# Altium footprint library RDM_ALT_PCB.PcbLib: 127 footprints (part 8 of 8)
Each footprint in its own frame and in the unit in brackets; x right, y up, seen from the top. Pads: shape width x height; smd on the part's side, far side on the other; paste and mask are expansions set on the pad; w line width, h text height; cw(c..) or ccw(c..) is an arc to the next point about the centre after c.
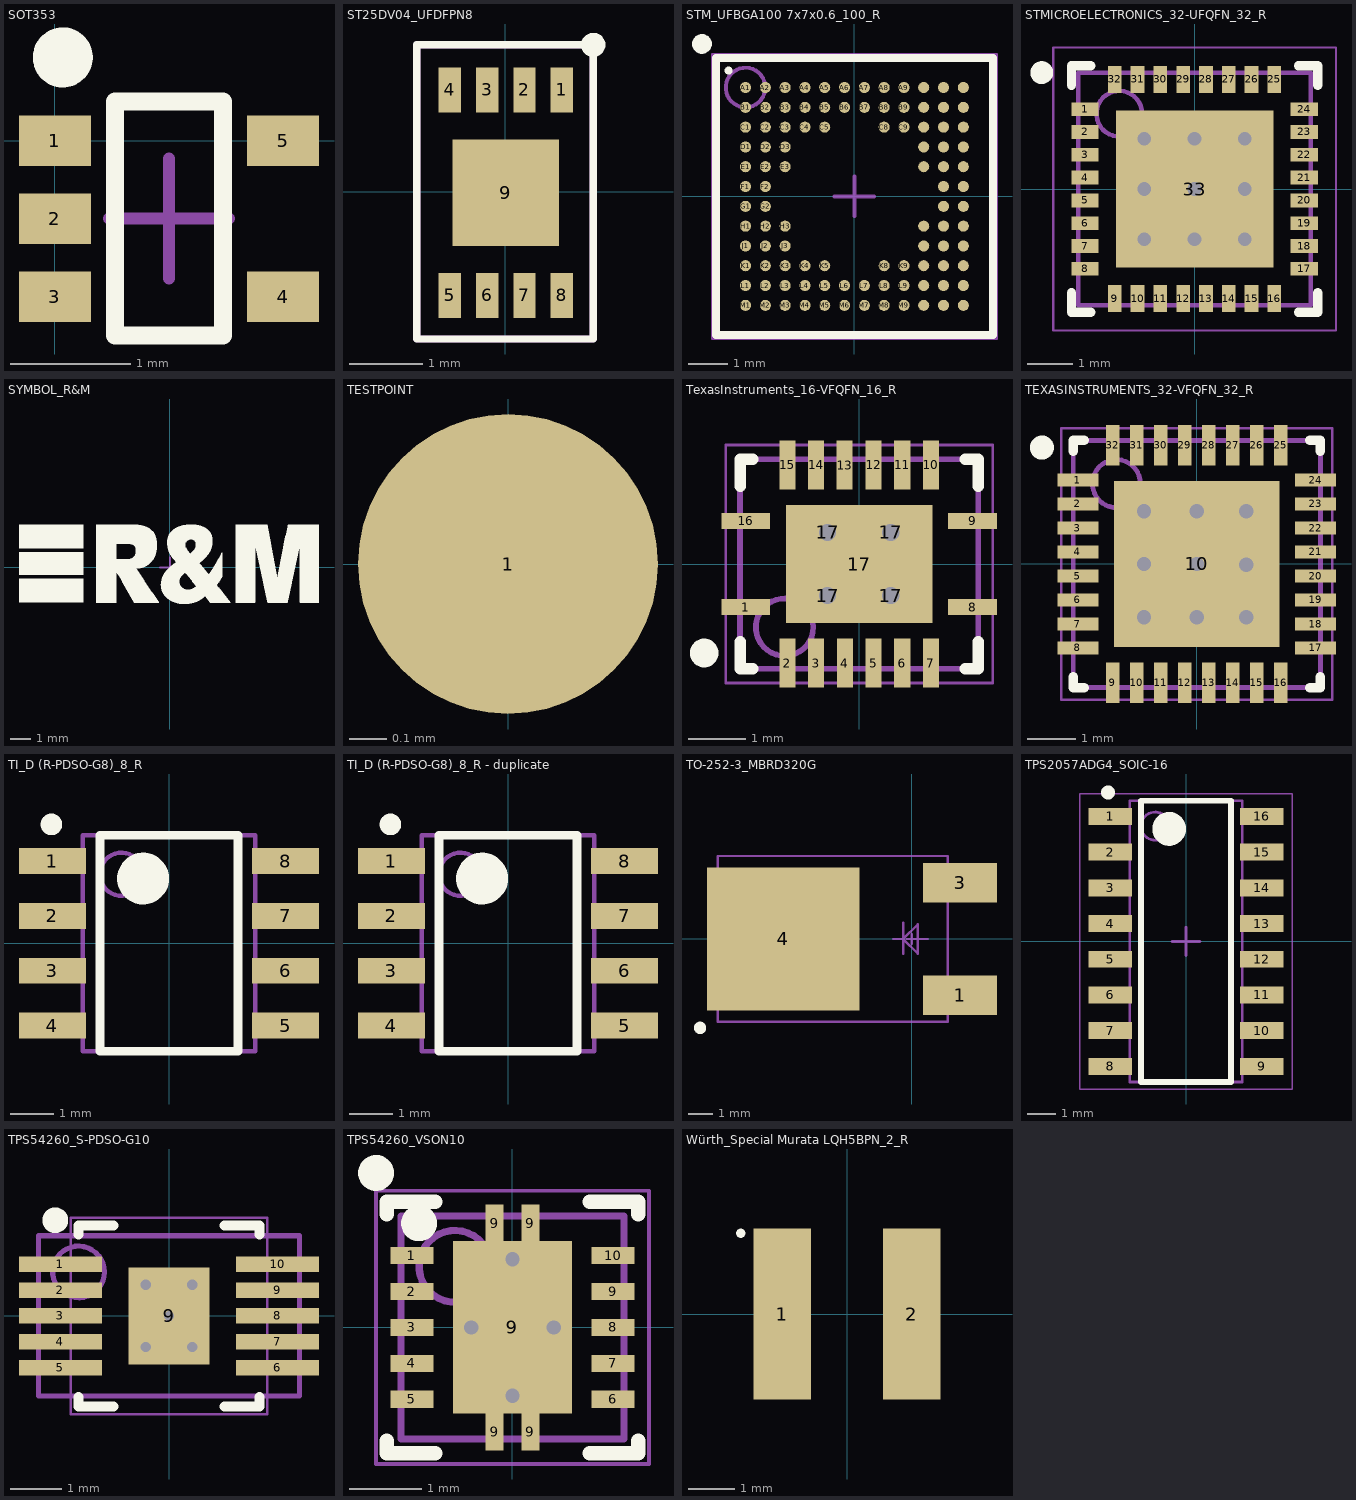
[diagram p7: the footprints below, top view; thin cyan lines are the x and y axes]

## SOT353 [mm]
pads (5):
  rect 0.6x0.42 smd: 1(0,0) 2(0,-0.65) 3(0,-1.3) 4(1.9,-1.3) 5(1.9,0)
Top Overlay:
  circle w0.25: c0.065,0.693 r0.125
  lines w0.15: 0.737,0.325 1.4,0.325 1.4,-1.625 0.5,-1.625 0.5,0.325 1.062,0.325
Mechanical 15:
  lines w0.1: 0.45,-0.65 1.45,-0.65 ; 0.95,-1.15 0.95,-0.15
3D body "SOT353-1.stp": height 1.09, standoff 0, extent -0.18,-1.78 2.08,0.48

## ST25DV04_UFDFPN8 [mil] "UFDFPN8"
height 23.62
pads (9):
  rect 12x24 smd: 1(30.39,54.61) 2(10.39,54.61) 3(-9.61,54.61) 4(-29.61,54.61) 5(-29.61,-55.39) 6(-9.61,-55.39) 7(10.39,-55.39) 8(30.39,-55.39)
  rect 57.09x57.09 smd: 9(0.39,-0.39)
Top Overlay:
  circle w6.69: c47.24,78.74 r3.15
  lines w3.94: -47.24,-78.74 -47.24,78.74 ; -47.24,-78.74 47.24,-78.74 ; -47.24,-78.74 47.24,-78.74 ; -47.24,-78.74 -47.24,78.74 ; -47.24,-78.74 -47.24,78.74 ; -47.24,-78.74 47.24,-78.74 ; -47.24,-78.74 47.24,-78.74 ; -47.24,-78.74 -47.24,78.74 ; -47.24,78.74 47.24,78.74 ; -47.24,78.74 47.24,78.74 ; -47.24,78.74 47.24,78.74 ; -47.24,78.74 47.24,78.74 ; 47.24,-78.74 47.24,78.74 ; 47.24,-78.74 47.24,78.74 ; 47.24,-78.74 47.24,78.74 ; 47.24,-78.74 47.24,78.74
Mechanical 15:
  circle w3.94: c0,0 r1.97
  lines w3.94: -47.24,-78.74 47.24,-78.74 47.24,78.74 -47.24,78.74 -47.24,-78.74
3D body "User Library-UFDFPN8.STEP": height 22.16, standoff 0.5, extent -39.37,-59.06 39.37,59.06

## STM_UFBGA100 7x7x0.6_100_R [mm] "STM_UFBGA100 7x7x0.6_100_R"
height 0.6
pads (100):
  round 0.28 smd mask+0.09: A1(-2.75,2.75) A2(-2.25,2.75) A3(-1.75,2.75) A4(-1.25,2.75) A5(-0.75,2.75) A6(-0.25,2.75) A7(0.25,2.75) A8(0.75,2.75) A9(1.25,2.75) A10(1.75,2.75) A11(2.25,2.75) A12(2.75,2.75) B1(-2.75,2.25) B2(-2.25,2.25) B3(-1.75,2.25) B4(-1.25,2.25) B5(-0.75,2.25) B6(-0.25,2.25) B7(0.25,2.25) B8(0.75,2.25) B9(1.25,2.25) B10(1.75,2.25) B11(2.25,2.25) B12(2.75,2.25) C1(-2.75,1.75) C2(-2.25,1.75) C3(-1.75,1.75) C4(-1.25,1.75) C5(-0.75,1.75) C8(0.75,1.75) C9(1.25,1.75) C10(1.75,1.75) C11(2.25,1.75) C12(2.75,1.75) D1(-2.75,1.25) D2(-2.25,1.25) D3(-1.75,1.25) D10(1.75,1.25) D11(2.25,1.25) D12(2.75,1.25) E1(-2.75,0.75) E2(-2.25,0.75) E3(-1.75,0.75) E10(1.75,0.75) E11(2.25,0.75) E12(2.75,0.75) F1(-2.75,0.25) F2(-2.25,0.25) F11(2.25,0.25) F12(2.75,0.25) G1(-2.75,-0.25) G2(-2.25,-0.25) G11(2.25,-0.25) G12(2.75,-0.25) H1(-2.75,-0.75) H2(-2.25,-0.75) H3(-1.75,-0.75) H10(1.75,-0.75) H11(2.25,-0.75) H12(2.75,-0.75) J1(-2.75,-1.25) J2(-2.25,-1.25) J3(-1.75,-1.25) J10(1.75,-1.25) J11(2.25,-1.25) J12(2.75,-1.25) K1(-2.75,-1.75) K2(-2.25,-1.75) K3(-1.75,-1.75) K4(-1.25,-1.75) K5(-0.75,-1.75) K8(0.75,-1.75) K9(1.25,-1.75) K10(1.75,-1.75) K11(2.25,-1.75) K12(2.75,-1.75) L1(-2.75,-2.25) L2(-2.25,-2.25) L3(-1.75,-2.25) L4(-1.25,-2.25) L5(-0.75,-2.25) L6(-0.25,-2.25) L7(0.25,-2.25) L8(0.75,-2.25) L9(1.25,-2.25) L10(1.75,-2.25) L11(2.25,-2.25) L12(2.75,-2.25) M1(-2.75,-2.75) M2(-2.25,-2.75) M3(-1.75,-2.75) M4(-1.25,-2.75) M5(-0.75,-2.75) M6(-0.25,-2.75) M7(0.25,-2.75) M8(0.75,-2.75) M9(1.25,-2.75) M10(1.75,-2.75) M11(2.25,-2.75) M12(2.75,-2.75)
Top Overlay:
  circle w0.2: c-3.175,3.175 r0.001
  circle w0.25: c-3.85,3.85 r0.125
  lines w0.2: -3.5,-3.5 -3.5,3.5 3.5,3.5 3.5,-3.5 -3.5,-3.5
Mechanical 13:
  circle w0.1: c-2.75,2.75 r0.5
  lines w0.1: -3.5,-3.5 -3.5,3.5 3.5,3.5 3.5,-3.5 -3.5,-3.5
Mechanical 15:
  lines w0.05: -3.6,-3.6 -3.6,3.6 3.6,3.6 3.6,-3.6 -3.6,-3.6
  lines w0.1: -0.5,0 0.5,0 ; 0,-0.5 0,0.5
3D body: height 0.6, standoff 0.11, extent -3.5,-3.5 3.5,3.5

## STMICROELECTRONICS_32-UFQFN_32_R [mm]
pads (33):
  rect 0.6x0.3 smd: 1(-2.4,1.75) 2(-2.4,1.25) 3(-2.4,0.75) 4(-2.4,0.25) 5(-2.4,-0.25) 6(-2.4,-0.75) 7(-2.4,-1.25) 8(-2.4,-1.75) 17(2.4,-1.75) 18(2.4,-1.25) 19(2.4,-0.75) 20(2.4,-0.25) 21(2.4,0.25) 22(2.4,0.75) 23(2.4,1.25) 24(2.4,1.75)
  rect 0.3x0.6 smd: 9(-1.75,-2.4) 10(-1.25,-2.4) 11(-0.75,-2.4) 12(-0.25,-2.4) 13(0.25,-2.4) 14(0.75,-2.4) 15(1.25,-2.4) 16(1.75,-2.4) 25(1.75,2.4) 26(1.25,2.4) 27(0.75,2.4) 28(0.25,2.4) 29(-0.25,2.4) 30(-0.75,2.4) 31(-1.25,2.4) 32(-1.75,2.4)
  rect 3.45x3.45 smd: 33(0,0)
via -1.1,1.1 diameter 0.5 hole 0.3
via 0,1.1 diameter 0.5 hole 0.3
via 1.1,1.1 diameter 0.5 hole 0.3
via -1.1,0 diameter 0.5 hole 0.3
via 0,0 diameter 0.5 hole 0.3
via 1.1,0 diameter 0.5 hole 0.3
via -1.1,-1.1 diameter 0.5 hole 0.3
via 0,-1.1 diameter 0.5 hole 0.3
via 1.1,-1.1 diameter 0.5 hole 0.3
Top Overlay:
  circle w0.25: c-3.35,2.55 r0.125
  lines w0.2: -2.7,-2.275 -2.7,-2.7 -2.275,-2.7 ; -2.7,2.275 -2.7,2.7 -2.275,2.7 ; 2.275,-2.7 2.7,-2.7 2.7,-2.275 ; 2.275,2.7 2.7,2.7 2.7,2.275
Mechanical 13:
  circle w0.1: c-1.65,1.65 r0.5
  lines w0.1: -2.55,-2.55 -2.55,2.55 2.55,2.55 2.55,-2.55 -2.55,-2.55
Mechanical 15:
  lines w0.05: -3.1,-3.1 -3.1,3.1 3.1,3.1 3.1,-3.1 -3.1,-3.1
  lines w0.1: -0.5,0 0.5,0 ; 0,-0.5 0,0.5
3D body "QFN50P500X500X60_HS-33N.step": height 0.6, standoff 0, extent -2.6,-2.6 2.6,2.6

## SYMBOL_R&M [mm] "Reichle & De-Massari printing"
Top Overlay:
  drawing of 1139 lines, arcs and shapes, not listed
Mechanical 15:
  lines w0.1: -0.5,0 0.5,0 ; 0,-0.5 0,0.5

## TESTPOINT [mm] "Testpoint"
pads (1):
  round 0.8 smd paste-0.8 mask+0.102: 1(0,0)

## TexasInstruments_16-VFQFN_16_R [mm]
pads (21):
  rect 0.85x0.28 smd: 1(-1.975,-0.75) 8(1.975,-0.75) 9(1.975,0.75) 16(-1.975,0.75)
  rect 0.28x0.85 smd: 2(-1.25,-1.725) 3(-0.75,-1.725) 4(-0.25,-1.725) 5(0.25,-1.725) 6(0.75,-1.725) 7(1.25,-1.725) 10(1.25,1.725) 11(0.75,1.725) 12(0.25,1.725) 13(-0.254,1.724) 14(-0.75,1.725) 15(-1.25,1.725)
  round 0.55 hole 0.3: 17(-0.55,-0.55) 17(-0.55,0.55) 17(0.55,-0.55) 17(0.55,0.55)
  rect 2.55x2.05 smd: 17(0,0)
Top Overlay:
  circle w0.25: c-2.7,-1.55 r0.125
  lines w0.2: -2.075,-1.35 -2.075,-1.825 -1.85,-1.825 ; -2.075,1.35 -2.075,1.825 -1.85,1.825 ; 1.85,-1.825 2.075,-1.825 2.075,-1.35 ; 1.85,1.825 2.075,1.825 2.075,1.35
Mechanical 13:
  circle w0.1: c-1.3,-1.1 r0.5
  lines w0.1: -2.075,-1.825 -2.075,1.825 2.075,1.825 2.075,-1.825 -2.075,-1.825
Mechanical 15:
  lines w0.05: -2.325,-2.075 -2.325,2.075 2.325,2.075 2.325,-2.075 -2.325,-2.075
  lines w0.1: -0.5,0 0.5,0 ; 0,-0.5 0,0.5
3D body "PQFN50P400X350X100_HS-17N.step": height 1, standoff 0, extent -2.075,-1.825 2.075,1.825

## TEXASINSTRUMENTS_32-VFQFN_32_R [mm]
pads (33):
  rect 0.85x0.28 smd: 1(-2.475,1.75) 2(-2.475,1.25) 3(-2.475,0.75) 4(-2.475,0.25) 5(-2.475,-0.25) 6(-2.475,-0.75) 7(-2.475,-1.25) 8(-2.475,-1.75) 17(2.475,-1.75) 18(2.475,-1.25) 19(2.475,-0.75) 20(2.475,-0.25) 21(2.475,0.25) 22(2.475,0.75) 23(2.475,1.25) 24(2.475,1.75)
  rect 0.28x0.85 smd: 9(-1.75,-2.475) 10(-1.25,-2.475) 11(-0.75,-2.475) 12(-0.25,-2.475) 13(0.25,-2.475) 14(0.75,-2.475) 15(1.25,-2.475) 16(1.75,-2.475) 25(1.75,2.475) 26(1.25,2.475) 27(0.75,2.475) 28(0.25,2.475) 29(-0.25,2.475) 30(-0.75,2.475) 31(-1.25,2.475) 32(-1.75,2.475)
  rect 3.45x3.45 smd: 10(0,0)
via -1.1,-1.112 diameter 0.55 hole 0.3
via 1.028,-0.012 diameter 0.55 hole 0.3
via 1.028,1.1 diameter 0.55 hole 0.3
via 1.028,-1.112 diameter 0.55 hole 0.3
via 0,-1.112 diameter 0.55 hole 0.3
via -1.1,0 diameter 0.55 hole 0.3
via 0,0 diameter 0.55 hole 0.3
via -1.1,1.1 diameter 0.55 hole 0.3
via 0,1.1 diameter 0.55 hole 0.3
Top Overlay:
  circle w0.25: c-3.225,2.425 r0.125
  lines w0.2: -2.575,-2.35 -2.575,-2.575 -2.35,-2.575 ; -2.575,2.35 -2.575,2.575 -2.35,2.575 ; 2.35,-2.575 2.575,-2.575 2.575,-2.35 ; 2.35,2.575 2.575,2.575 2.575,2.35
Mechanical 13:
  circle w0.1: c-1.675,1.675 r0.5
  lines w0.1: -2.575,-2.575 2.575,-2.575 2.575,2.575 -2.575,2.575 -2.575,-2.575
Mechanical 15:
  lines w0.05: -2.825,-2.825 2.825,-2.825 2.825,2.825 -2.825,2.825 -2.825,-2.825
  lines w0.1: -0.5,0 0.5,0 ; 0,-0.5 0,0.5
3D body "PQFN50P500X500X100_HS-33N.step": height 1, standoff 0, extent -2.575,-2.575 2.575,2.575

## TI_D (R-PDSO-G8)_8_R [mm] "TI_D (R-PDSO-G8)_8_R"
height 1.75
pads (8):
  rect 1.55x0.6 smd: 1(-2.7,1.905) 2(-2.7,0.635) 3(-2.7,-0.635) 4(-2.7,-1.905) 5(2.7,-1.905) 6(2.7,-0.635) 7(2.7,0.635) 8(2.7,1.905)
Top Overlay:
  circle w0.6: c-0.6,1.5 r0.3
  circle w0.25: c-2.725,2.755 r0.125
  lines w0.2: -1.6,-2.5 1.6,-2.5 1.6,2.5 -1.6,2.5 -1.6,-2.5
Mechanical 13:
  circle w0.1: c-1.1,1.6 r0.5
  lines w0.1: -2,-2.5 2,-2.5 2,2.5 -2,2.5 -2,-2.5
3D body "SOIC-8akaD0008AakaM08A.stp": height 1.63, standoff 0, extent -3,-2.45 3,2.45

## TI_D (R-PDSO-G8)_8_R - duplicate [mm] "TI_D (R-PDSO-G8)_8_R"
height 1.75
pads (8):
  rect 1.55x0.6 smd: 1(-2.7,1.905) 2(-2.7,0.635) 3(-2.7,-0.635) 4(-2.7,-1.905) 5(2.7,-1.905) 6(2.7,-0.635) 7(2.7,0.635) 8(2.7,1.905)
Top Overlay:
  circle w0.6: c-0.6,1.5 r0.3
  circle w0.25: c-2.725,2.755 r0.125
  lines w0.2: -1.6,-2.5 1.6,-2.5 1.6,2.5 -1.6,2.5 -1.6,-2.5
Mechanical 13:
  circle w0.1: c-1.1,1.6 r0.5
  lines w0.1: -2,-2.5 2,-2.5 2,2.5 -2,2.5 -2,-2.5
3D body "SOIC-8akaD0008AakaM08A.stp": height 1.63, standoff 0, extent -3,-2.45 3,2.45

## TO-252-3_MBRD320G [mm] "TO-252-3_MBRD320G"
height 2.47
pads (3):
  rect 3x1.6 smd: 1(1.959,-2.285) 3(1.959,2.285)
  rect 6.2x5.8 smd: 4(-5.221,0)
Top Overlay:
  circle w0.25: c-8.593,-3.607 r0.125
Mechanical 1:
  lines w0.1: -0.2,0 0.2,0 ; 0,-0.2 0,0.2
Mechanical 13:
  lines w0.1: -7.871,-3.363 1.466,-3.363 1.466,3.369 -7.871,3.369 -7.871,-3.363
Mechanical 15:
  lines w0.1: -0.75,0 -0.35,0 ; -0.35,-0.6 -0.35,0.6 -0.35,0.65 ; 0.25,0 0.65,0 ; -0.35,0 0.25,-0.6 0.25,0.6 -0.35,0
3D body "DPAK.step": height 2.44, standoff 0, extent -7.871,-3.363 1.466,3.369

## TPS2057ADG4_SOIC-16 [mm] "SOIC, 16-Leads, Body 10.00x4.00mm, Pitch 1.27mm, IPC Medium Density"
height 1.75
pads (16):
  rect 1.55x0.6 smd: 1(-2.7,4.445) 2(-2.7,3.175) 3(-2.7,1.905) 4(-2.7,0.635) 5(-2.7,-0.635) 6(-2.7,-1.905) 7(-2.7,-3.175) 8(-2.7,-4.445) 9(2.7,-4.445) 10(2.7,-3.175) 11(2.7,-1.905) 12(2.7,-0.635) 13(2.7,0.635) 14(2.7,1.905) 15(2.7,3.175) 16(2.7,4.445)
Top Overlay:
  circle w0.6: c-0.6,4 r0.3
  circle w0.25: c-2.775,5.295 r0.125
  lines w0.2: -1.6,-5 1.6,-5 1.6,5 -1.6,5 -1.6,-5
Mechanical 13:
  circle w0.1: c-1.1,4.1 r0.5
  lines w0.1: -2,-5 2,-5 2,5 -2,5 -2,-5
Mechanical 15:
  lines w0.05: -3.775,-5.25 3.775,-5.25 3.775,5.25 -3.775,5.25 -3.775,-5.25
  lines w0.1: -0.5,0 0.5,0 ; 0,-0.5 0,0.5
3D body "D16.stp": height 1.76, standoff 0, extent -3.099,-5.004 3.099,5.004

## TPS54260_S-PDSO-G10 [mm] "PSO Package  10-Pin"
height 1.1
pads (11):
  rect 1.6x0.3 smd paste-0.025 mask+0.07: 1(-2.1,1) 2(-2.1,0.5) 3(-2.1,0) 4(-2.1,-0.5) 5(-2.1,-1) 6(2.1,-1) 7(2.1,-0.5) 8(2.1,0) 9(2.1,0.5) 10(2.1,1)
  rect 1.57x1.88 smd: 9(0,0)
via 0,0 diameter 0.3 hole 0.2
via -0.45,0.6 diameter 0.3 hole 0.2
via -0.45,-0.6 diameter 0.3 hole 0.2
via 0.45,-0.6 diameter 0.3 hole 0.2
via 0.45,0.6 diameter 0.3 hole 0.2
Top Overlay:
  circle w0.25: c-2.2,1.85 r0.125
  lines w0.2: -1.75,-1.575 -1.75,-1.75 -1.075,-1.75 ; -1.75,1.575 -1.75,1.75 -1.075,1.75 ; 1.075,-1.75 1.75,-1.75 1.75,-1.575 ; 1.075,1.75 1.75,1.75 1.75,1.575
Mechanical 13:
  circle w0.1: c-1.75,0.85 r0.5
  lines w0.1: -2.525,-1.55 -2.525,1.55 2.525,1.55 2.525,-1.55 -2.525,-1.55
Mechanical 15:
  lines w0.05: -1.9,-1.9 -1.9,1.9 1.9,1.9 1.9,-1.9 -1.9,-1.9
  lines w0.1: -0.5,0 0.5,0 ; 0,-0.5 0,0.5
3D body "DGQ10_1P88X1P57.step": height 1.7, standoff 0, extent -2.525,-1.55 2.525,1.55

## TPS54260_VSON10 [mm] "DRC Package  10-Pin VSON"
height 1
pads (15):
  rect 0.6x0.24 smd mask+0.07: 1(-1.4,1) 2(-1.4,0.5) 3(-1.4,0) 4(-1.4,-0.5) 5(-1.4,-1) 6(1.4,-1) 7(1.4,-0.5) 8(1.4,0) 9(1.4,0.5) 10(1.4,1)
  rect 0.25x0.52 smd mask+0.07: 9(-0.25,-1.45) 9(-0.25,1.45) 9(0.25,-1.45) 9(0.25,1.45)
  rect 1.65x2.4 smd: 9(0,0)
via 0.575,0 diameter 0.3 hole 0.2
via 0,0.95 diameter 0.3 hole 0.2
via 0,-0.95 diameter 0.3 hole 0.2
via -0.575,0 diameter 0.3 hole 0.2
Top Overlay:
  circle w0.25: c-1.3,1.45 r0.125
  circle w0.25: c-1.9,2.15 r0.125
  lines w0.2: -1.75,-1.575 -1.75,-1.75 -1.075,-1.75 ; -1.75,1.575 -1.75,1.75 -1.075,1.75 ; 1.075,-1.75 1.75,-1.75 1.75,-1.575 ; 1.075,1.75 1.75,1.75 1.75,1.575
Mechanical 13:
  circle w0.1: c-0.8,0.85 r0.5
  lines w0.1: -1.55,-1.55 -1.55,1.55 1.55,1.55 1.55,-1.55 -1.55,-1.55
Mechanical 15:
  lines w0.05: -1.9,-1.9 -1.9,1.9 1.9,1.9 1.9,-1.9 -1.9,-1.9
  lines w0.1: -0.5,0 0.5,0 ; 0,-0.5 0,0.5
3D body "DRC10_2P4X1P65.stp": height 1, standoff 0, extent -1.55,-1.55 1.55,1.55

## Würth_Special Murata LQH5BPN_2_R [mm] "Würth_Special Murata LQH5BPN_2_R"
height 4
pads (2):
  rect 1.25x3.7 smd: 1(-1.4,0) 2(1.4,0)
Top Overlay:
  circle w0.2: c-2.3,1.75 r0
3D body "STEP-WE-MAPI-4030-rev1.stp": height 3.1, standoff 0, extent -2.05,-2.05 2.05,2.05
3D body: height 4, standoff 0, extent -2.45,-2.45 2.45,2.45